# Altium footprint library Macropad.PcbLib: 6 footprints
Each footprint in its own frame and in the unit in brackets; x right, y up, seen from the top. Pads: shape width x height; smd on the part's side, far side on the other; paste and mask are expansions set on the pad; w line width, h text height; cw(c..) or ccw(c..) is an arc to the next point about the centre after c.
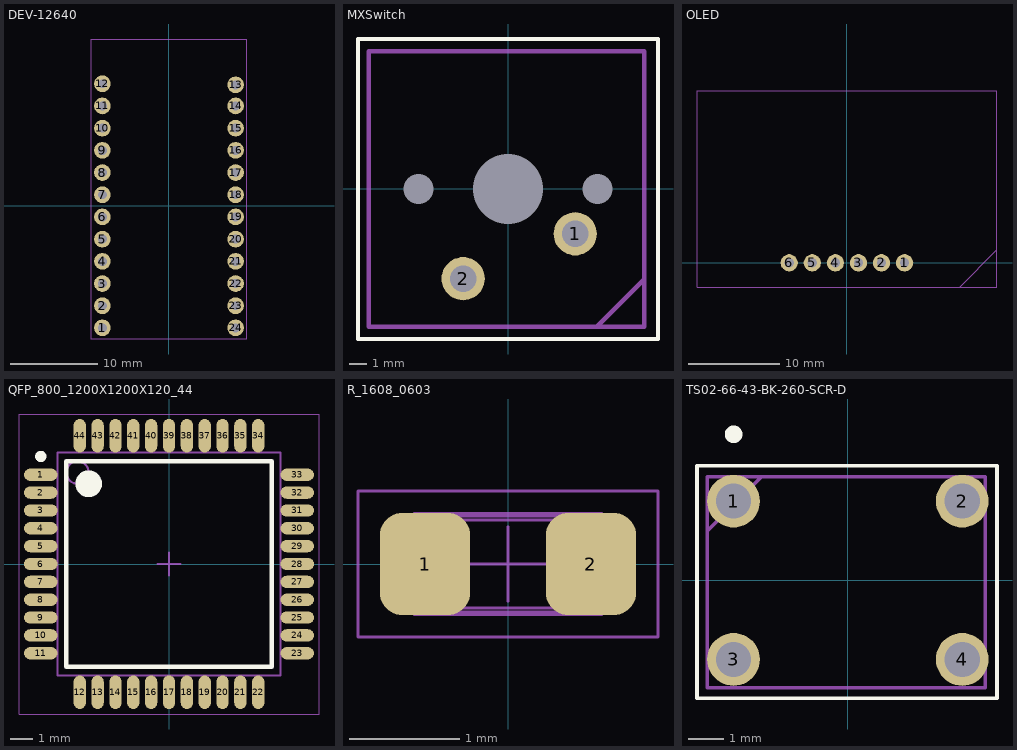
[diagram p0: the footprints below, top view; thin cyan lines are the x and y axes]

## DEV-12640 [mil] "Pro Micro"
pads (24):
  round 75 hole 40: 1(-300,-550) 2(-300,-450) 3(-300,-350) 4(-300,-250) 5(-300,-150) 6(-300,-50) 7(-300,50) 8(-300,150) 9(-300,250) 10(-300,350) 11(-300,450) 12(-300,550) 13(300,545) 14(300,450) 15(300,350) 16(300,250) 17(300,150) 18(300,50) 19(300,-50) 20(300,-150) 21(300,-250) 22(300,-350) 23(300,-450) 24(300,-550)
Mechanical 9:
  lines w3.94: -350,-600 -350,751.58 ; -350,-600 350,-600 ; -350,-600 -350,751.58 ; -350,-600 350,-600 ; -350,751.58 350,751.58 ; -350,751.58 350,751.58 ; 350,-600 350,751.58 ; 350,-600 350,751.58
Mechanical 13:
  lines w3.94: -350,-600 -350,751.58 350,751.58 350,-600 -350,-600
  text ".Designator" at -201.57,49.4 h118.11
3D body "Pin Header 1x12 TH Pitch 2.54mm.stp": height 373.85, standoff -125.98, extent -350,-600 -250,600
3D body "Pin Header 1x12 TH Pitch 2.54mm.stp": height 373.85, standoff -125.98, extent 250,-600 350,600
3D body "Pro_Micro.STEP": height 279.33, standoff 110.24, extent -350,-600 350,751.58

## MXSwitch [mil]
pads (5):
  round 96.46 hole 59: 1(150,-100) 2(-100,-200)
  round 0 hole 67: ""(-200,0) ""(200,0)
  round 60 hole 157: ""(0,0)
Top Overlay:
  lines w10: -334.65,-334.65 334.65,-334.65 334.65,334.65 -334.65,334.65 -334.65,-334.65
Mechanical 9:
  lines w10: -310.24,-307.09 -310.24,307.08 303.94,307.08 303.94,-307.09 -310.24,-307.09
Mechanical 13:
  lines w10: -310.24,-307.09 -310.24,307.08 303.94,307.08 303.94,-201.18 198.03,-307.09 -310.24,-307.09
  text ".Designator" at -298.43,223.41 h118.11
3D body "MX Series-Cherry Key.STEP": height 600.3, standoff -143.8, extent -310.24,-307.09 303.94,307.08

## OLED [mil]
pads (6):
  round 75 hole 40: 1(250,0) 2(150,0) 3(50,0) 4(-50,0) 5(-150,0) 6(-250,0)
Mechanical 9:
  lines w3.94: -649.61,-105.12 -649.61,744.88 650.39,744.88 650.39,-105.12 -649.61,-105.12
Mechanical 13:
  lines w3.94: -649.61,-105.12 488.19,-105.12 650.39,57.09 650.39,744.88 -649.61,744.88 -649.61,-105.12
  text ".Designator" at -298.82,317.51 h118.11
3D body "OLED.STEP": height 162.6, standoff 92.91, extent -649.61,-104.72 650.39,745.28
3D body "Pin Header 1x6 TH Pitch 2.54mm.stp": height 222.62, standoff -277.21, extent -300,-49.39 300,50.61

## QFP_800_1200X1200X120_44 [mm] "TQFP, 44-Leads, Body 10.00x10.00mm, Pitch 0.80mm, IPC Medium Density"
height 1.2
pads (44):
  oval 1.5x0.55 smd: 1(-5.75,4) 2(-5.75,3.2) 3(-5.75,2.4) 4(-5.75,1.6) 5(-5.75,0.8) 6(-5.75,0) 7(-5.75,-0.8) 8(-5.75,-1.6) 9(-5.75,-2.4) 10(-5.75,-3.2) 11(-5.75,-4) 23(5.75,-4) 24(5.75,-3.2) 25(5.75,-2.4) 26(5.75,-1.6) 27(5.75,-0.8) 28(5.75,0) 29(5.75,0.8) 30(5.75,1.6) 31(5.75,2.4) 32(5.75,3.2) 33(5.75,4)
  oval 0.55x1.5 smd: 12(-4,-5.75) 13(-3.2,-5.75) 14(-2.4,-5.75) 15(-1.6,-5.75) 16(-0.8,-5.75) 17(0,-5.75) 18(0.8,-5.75) 19(1.6,-5.75) 20(2.4,-5.75) 21(3.2,-5.75) 22(4,-5.75) 34(4,5.75) 35(3.2,5.75) 36(2.4,5.75) 37(1.6,5.75) 38(0.8,5.75) 39(0,5.75) 40(-0.8,5.75) 41(-1.6,5.75) 42(-2.4,5.75) 43(-3.2,5.75) 44(-4,5.75)
Top Overlay:
  circle w0.6: c-3.6,3.6 r0.3
  circle w0.25: c-5.75,4.825 r0.125
  lines w0.2: -4.6,-4.6 4.6,-4.6 4.6,4.6 -4.6,4.6 -4.6,-4.6
Mechanical 13:
  circle w0.1: c-4.1,4.1 r0.5
  lines w0.1: -5,-5 5,-5 5,5 -5,5 -5,-5
Mechanical 15:
  lines w0.05: -6.725,-6.725 6.725,-6.725 6.725,6.725 -6.725,6.725 -6.725,-6.725
  lines w0.1: -0.5,0 0.5,0 ; 0,-0.5 0,0.5
3D body "QFP_800_1200X1200X120_44.step": height 1.2, standoff 0, extent -6,-6 6,6

## R_1608_0603 [mm] "Resistor, Chip; 1.60 mm L X 0.80 mm W X 0.55 mm H body"
height 0.55
pads (2):
  rrect49% 0.82x0.93 smd: 1(-0.755,0) 2(0.755,0)
Mechanical 9:
  lines w0.05: -0.85,-0.45 -0.85,0.45 0.85,0.45 0.85,-0.45 -0.85,-0.45
  text ".Designator" at -0.756,-0.195 h0.6
Mechanical 11:
  lines w0.025: -0.8,-0.4 -0.5,-0.4 -0.5,0.4 -0.8,0.4 -0.8,-0.4 ; 0.5,-0.4 0.5,0.4 0.8,0.4 0.8,-0.4 0.5,-0.4
Mechanical 13:
  lines w0.025: -0.8,-0.4 -0.8,0.4 0.8,0.4 0.8,-0.4 -0.8,-0.4
Mechanical 15:
  lines w0.025: -0.339,0 0.339,0 ; 0,-0.339 0,0.339 ; -1.365,-0.664 -1.365,0.664 1.365,0.664 1.365,-0.664 -1.365,-0.664
3D body "R_1608_0603.STEP": height 0.55, standoff 0, extent -0.85,-0.45 0.85,0.45

## TS02-66-43-BK-260-SCR-D [mm] "6 X 6 MM, 4.3 MM ACTUATOR HEIGHT"
pads (4):
  round 1.5 hole 1: 1(-3.25,2.25) 2(3.25,2.25) 3(-3.25,-2.25) 4(3.25,-2.25)
Top Overlay:
  circle w0.25: c-3.25,4.15 r0.125
  lines w0.1: -4.29,-3.35 -4.29,3.25 4.24,3.25 4.24,-3.35 -4.29,-3.35
Mechanical 9:
  lines w0.1: -4,-3.05 -4,2.95 3.9,2.95 3.9,-3.05 -4,-3.05
Mechanical 13:
  lines w0.1: -4,-3.05 3.9,-3.05 3.9,2.95 -2.45,2.95 -4,1.4 -4,-3.05
  text ".Designator" at -3.52,-0.44 h2
3D body "CUI_DEVICES_TS02-66-43-BK-100-LCR-D.step": height 4.3, standoff -3.5, extent -4,-3.05 3.9,2.95